# Altium footprint library goldpin_male_pcb.PcbLib: 157 footprints (part 3 of 10)
Each footprint in its own frame and in the unit in brackets; x right, y up, seen from the top. Pads: shape width x height; smd on the part's side, far side on the other; paste and mask are expansions set on the pad; w line width, h text height; cw(c..) or ccw(c..) is an arc to the next point about the centre after c.
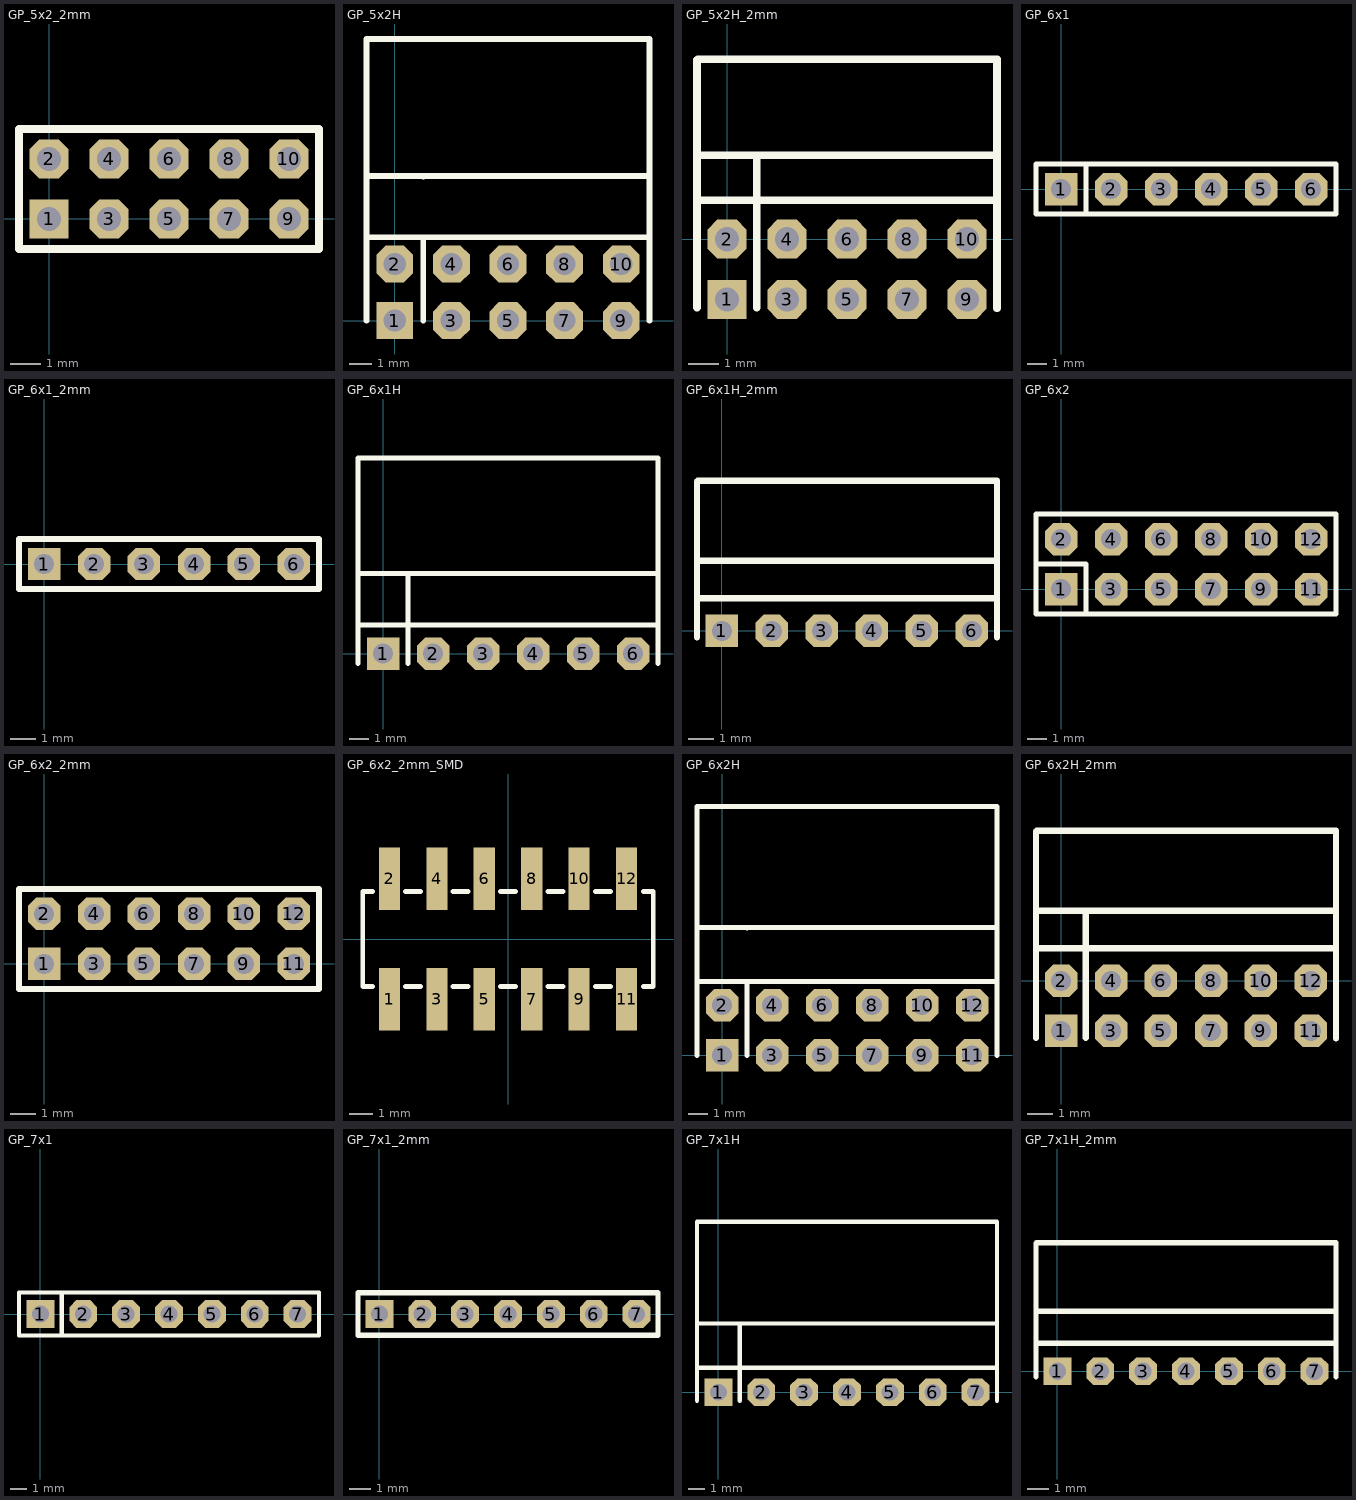
[diagram p2: the footprints below, top view; thin cyan lines are the x and y axes]

## GP_5x2_2mm [mm]
height 4.45
pads (10):
  rect 1.3x1.3 hole 0.8: 1(0,0)
  oct 1.3x1.3 hole 0.8: 2(0,2) 3(2,0) 4(2,2) 5(4,0) 6(4,2) 7(6,0) 8(6,2) 9(8,0) 10(8,2)
Top Overlay:
  lines w0.254: -1,-1 9,-1 9,2.999 -1,2.999 -1,-1
3D body "Samtec-TMM-105-03-G-D.STEP": height 6.51, standoff -1.69, extent -1,-0.968 9,2.969

## GP_5x2H [mil]
pads (10):
  rect 65x65 hole 39.37: 1(0,0)
  oct 65x65 hole 39.37: 2(0,100) 3(100,0) 4(100,100) 5(200,0) 6(200,100) 7(300,0) 8(300,100) 9(400,0) 10(400,100)
Top Overlay:
  lines w10: -50,0 -50,180.31 -50,497.64 450,497.64 450,280.31 450,0 ; -50,147.24 350,147.24 449.76,147.24 450,147 ; -50,255.51 450,255.51 ; 49.21,255.51 50,254.72 ; 50,0 50,147.24
3D body "Samtec-TSW-105-08-F-D-RA.STEP": height 220.08, standoff -89.92, extent -50,-10 450,492.5

## GP_5x2H_2mm [mm]
height 4.45
pads (10):
  rect 1.3x1.3 hole 0.8: 1(0,-2)
  oct 1.3x1.3 hole 0.8: 2(0,0) 3(2,-2) 4(2,0) 5(4,-2) 6(4,0) 7(6,-2) 8(6,0) 9(8,-2) 10(8,0)
Top Overlay:
  lines w0.254: -1,-2.275 -1,1.822 -1,5.973 ; -1,1.3 8.994,1.3 ; -1,2.8 9,2.8 ; 0.99,-2.275 0.99,2.775 ; 9,-2.3 9,6
  lines w0.256: -1,5.973 -0.973,6 9,6
3D body "Samtec-TMM-105-03-G-D-RA.STEP": height 3.97, standoff -3.02, extent -1.025,-2.261 8.975,5.961

## GP_6x1 [mil]
pads (6):
  rect 65x65 hole 39.37: 1(0,0)
  oct 65x65 hole 39.37: 2(100,0) 3(200,0) 4(300,0) 5(400,0) 6(500,0)
Top Overlay:
  lines w10: 50,-50 50,50 ; -50,-50 550,-50 550,50 -50,50 -50,-50
3D body "Samtec-TSW-106-23-F-S.STEP": height 330, standoff -115, extent -50,-50 550,50

## GP_6x1_2mm [mm]
height 4.45
pads (6):
  rect 1.3x1.3 hole 0.8: 1(0,0)
  oct 1.3x1.3 hole 0.8: 2(2,0) 3(4,0) 4(6,0) 5(8,0) 6(10,0)
Top Overlay:
  lines w0.254: -1,-1 -1,1 11,1 11,-1 -1,-1
3D body "Samtec-TMM-106-03-G-S.STEP": height 5.51, standoff -2.69, extent -1,-0.99 11,0.991

## GP_6x1H [mil]
pads (6):
  rect 65x65 hole 39.37: 1(0,0)
  oct 65x65 hole 39.37: 2(100,0) 3(200,0) 4(300,0) 5(400,0) 6(500,0)
Top Overlay:
  lines w10: -50,-19.68 -50,80.31 -50,390.75 550,390.75 550,-19.68 ; -50,160.51 550,160.51 ; -45,57.24 550,57.24 ; 50,-19.68 50,80.31 50,160.51
3D body "Samtec-TSW-106-08-F-S-RA.STEP": height 120, standoff -90, extent -50.2,-11.81 549.8,390.69

## GP_6x1H_2mm [mm]
height 4.45
pads (6):
  rect 1.3x1.3 hole 0.8: 1(0,0)
  oct 1.3x1.3 hole 0.8: 2(2,0) 3(4,0) 4(6,0) 5(8,0) 6(10,0)
Top Overlay:
  lines w0.254: -1,-0.25 -1,1.822 -1,5.973 ; -1,1.3 11,1.3 ; -1,2.8 11,2.8
  lines w0.256: -1,5.973 -0.973,6 11,6 11,-0.25
3D body "Samtec-TMM-106-03-G-S-RA.STEP": height 1.99, standoff -3.04, extent -1,-0.25 11,5.973

## GP_6x2 [mil]
pads (12):
  rect 65x65 hole 39.37: 1(0,0)
  oct 65x65 hole 39.37: 2(0,100) 3(100,0) 4(100,100) 5(200,0) 6(200,100) 7(300,0) 8(300,100) 9(400,0) 10(400,100) 11(500,0) 12(500,100)
Top Overlay:
  lines w10: -50,50 50,50 50,-50 ; -50,-50 -50,150 550,150 550,-50 -50,-50
3D body "Samtec-TSW-106-23-F-D.STEP": height 330, standoff -115, extent -50,-50 550,150

## GP_6x2_2mm [mm]
height 4.45
pads (12):
  rect 1.3x1.3 hole 0.8: 1(0,0)
  oct 1.3x1.3 hole 0.8: 2(0,2) 3(2,0) 4(2,2) 5(4,0) 6(4,2) 7(6,0) 8(6,2) 9(8,0) 10(8,2) 11(10,0) 12(10,2)
Top Overlay:
  lines w0.254: -1,-1 -1,2.999 11,2.999 11,-1 -1,-1
3D body "Samtec-TMM-106-03-G-D.STEP": height 5.51, standoff -2.69, extent -1,-0.968 11,2.969

## GP_6x2_2mm_SMD [mm]
pads (12):
  rect 0.89x2.65 smd: 1(-5,-2.54) 2(-5,2.54) 3(-3,-2.54) 4(-3,2.54) 5(-1,-2.54) 6(-1,2.54) 7(1,-2.54) 8(1,2.54) 9(3,-2.54) 10(3,2.54) 11(5,-2.54) 12(5,2.54)
Top Overlay:
  lines w0.2: -5.7,-2 -6.125,-2 -6.125,2 -5.7,2 ; -4.325,-2 -3.675,-2 ; -4.325,2 -3.675,2 ; -2.325,-2 -1.675,-2 ; -2.325,2 -1.675,2 ; -0.325,-2 0.325,-2 ; -0.325,2 0.325,2 ; 1.675,-2 2.325,-2 ; 1.675,2 2.325,2 ; 3.675,-2 4.325,-2 ; 3.675,2 4.325,2 ; 5.7,-2 6.125,-2 6.125,2 5.7,2
3D body "Samtec-TMM-106-01-G-D-SM.STEP": height 5.9, standoff -0.07, extent -6,-3.27 6,3.334

## GP_6x2H [mil]
pads (12):
  rect 65x65 hole 39.37: 1(0,0)
  oct 65x65 hole 39.37: 2(0,100) 3(100,0) 4(100,100) 5(200,0) 6(200,100) 7(300,0) 8(300,100) 9(400,0) 10(400,100) 11(500,0) 12(500,100)
Top Overlay:
  lines w10: -50,0 -50,180.31 -50,497.64 550,497.64 550,0 ; -50,147.24 550,147.24 ; -50,255.51 550,255.51 ; 49.21,255.51 50,254.72 ; 50,0 50,147.24
3D body "Samtec-TSW-106-08-F-D-RA.STEP": height 220.08, standoff -89.92, extent -50,-12.5 550,490

## GP_6x2H_2mm [mm]
height 4.45
pads (12):
  rect 1.3x1.3 hole 0.8: 1(0,-2)
  oct 1.3x1.3 hole 0.8: 2(0,0) 3(2,-2) 4(2,0) 5(4,-2) 6(4,0) 7(6,-2) 8(6,0) 9(8,-2) 10(8,0) 11(10,-2) 12(10,0)
Top Overlay:
  lines w0.254: -1,-2.275 -1,1.822 -1,5.973 ; -1,1.3 11,1.3 ; -1,2.8 11,2.8 ; 0.99,-2.275 0.99,2.775 ; 11,-2.3 11,6
  lines w0.256: -1,5.973 -0.973,6 11,6
3D body "Samtec-TMM-106-03-G-D-RA.STEP": height 3.97, standoff -3.02, extent -1.025,-2.261 10.975,5.961

## GP_7x1 [mil]
pads (7):
  rect 65x65 hole 39.37: 1(0,0)
  oct 65x65 hole 39.37: 2(100,0) 3(200,0) 4(300,0) 5(400,0) 6(500,0) 7(600,0)
Top Overlay:
  lines w10: 50,-50 50,50 ; -50,-50 650,-50 650,50 -50,50 -50,-50
3D body "Samtec-TSW-107-23-F-S.STEP": height 330, standoff -115, extent -50,-50 650,50

## GP_7x1_2mm [mm]
height 4.45
pads (7):
  rect 1.3x1.3 hole 0.8: 1(0,0)
  oct 1.3x1.3 hole 0.8: 2(2,0) 3(4,0) 4(6,0) 5(8,0) 6(10,0) 7(12,0)
Top Overlay:
  lines w0.254: -1,-1 -1,1 13,1 13,-1 -1,-1
3D body "Samtec-TMM-107-03-G-S.STEP": height 5.51, standoff -2.69, extent -1,-0.99 13,0.991

## GP_7x1H [mil]
pads (7):
  rect 65x65 hole 39.37: 1(0,0)
  oct 65x65 hole 39.37: 2(100,0) 3(200,0) 4(300,0) 5(400,0) 6(500,0) 7(600,0)
Top Overlay:
  lines w10: -50,-19.68 -50,80.31 -50,397.64 650,397.64 650,-19.68 ; -50,57.24 650,57.24 ; -50,160.51 650,160.51 ; 50,-19.68 50,80.31 50,160.51
3D body "Samtec-TSW-107-08-F-S-RA.STEP": height 120, standoff -90, extent -50,-10 650,392.5

## GP_7x1H_2mm [mm]
height 4.45
pads (7):
  rect 1.3x1.3 hole 0.8: 1(0,0)
  oct 1.3x1.3 hole 0.8: 2(2,0) 3(4,0) 4(6,0) 5(8,0) 6(10,0) 7(12,0)
Top Overlay:
  lines w0.254: -1,-0.25 -1,1.822 -1,5.973 ; -1,1.3 13,1.3 ; -1,2.8 13,2.8
  lines w0.256: -1,5.973 -0.973,6 13,6 13,-0.25
3D body "Samtec-TMM-107-03-G-S-RA.STEP": height 1.99, standoff -3.04, extent -1,-0.25 13,5.973